# Altium footprint library 7-Connectors-12.PcbLib: 76 footprints (part 3 of 5)
Each footprint in its own frame and in the unit in brackets; x right, y up, seen from the top. Pads: shape width x height; smd on the part's side, far side on the other; paste and mask are expansions set on the pad; w line width, h text height; cw(c..) or ccw(c..) is an arc to the next point about the centre after c.
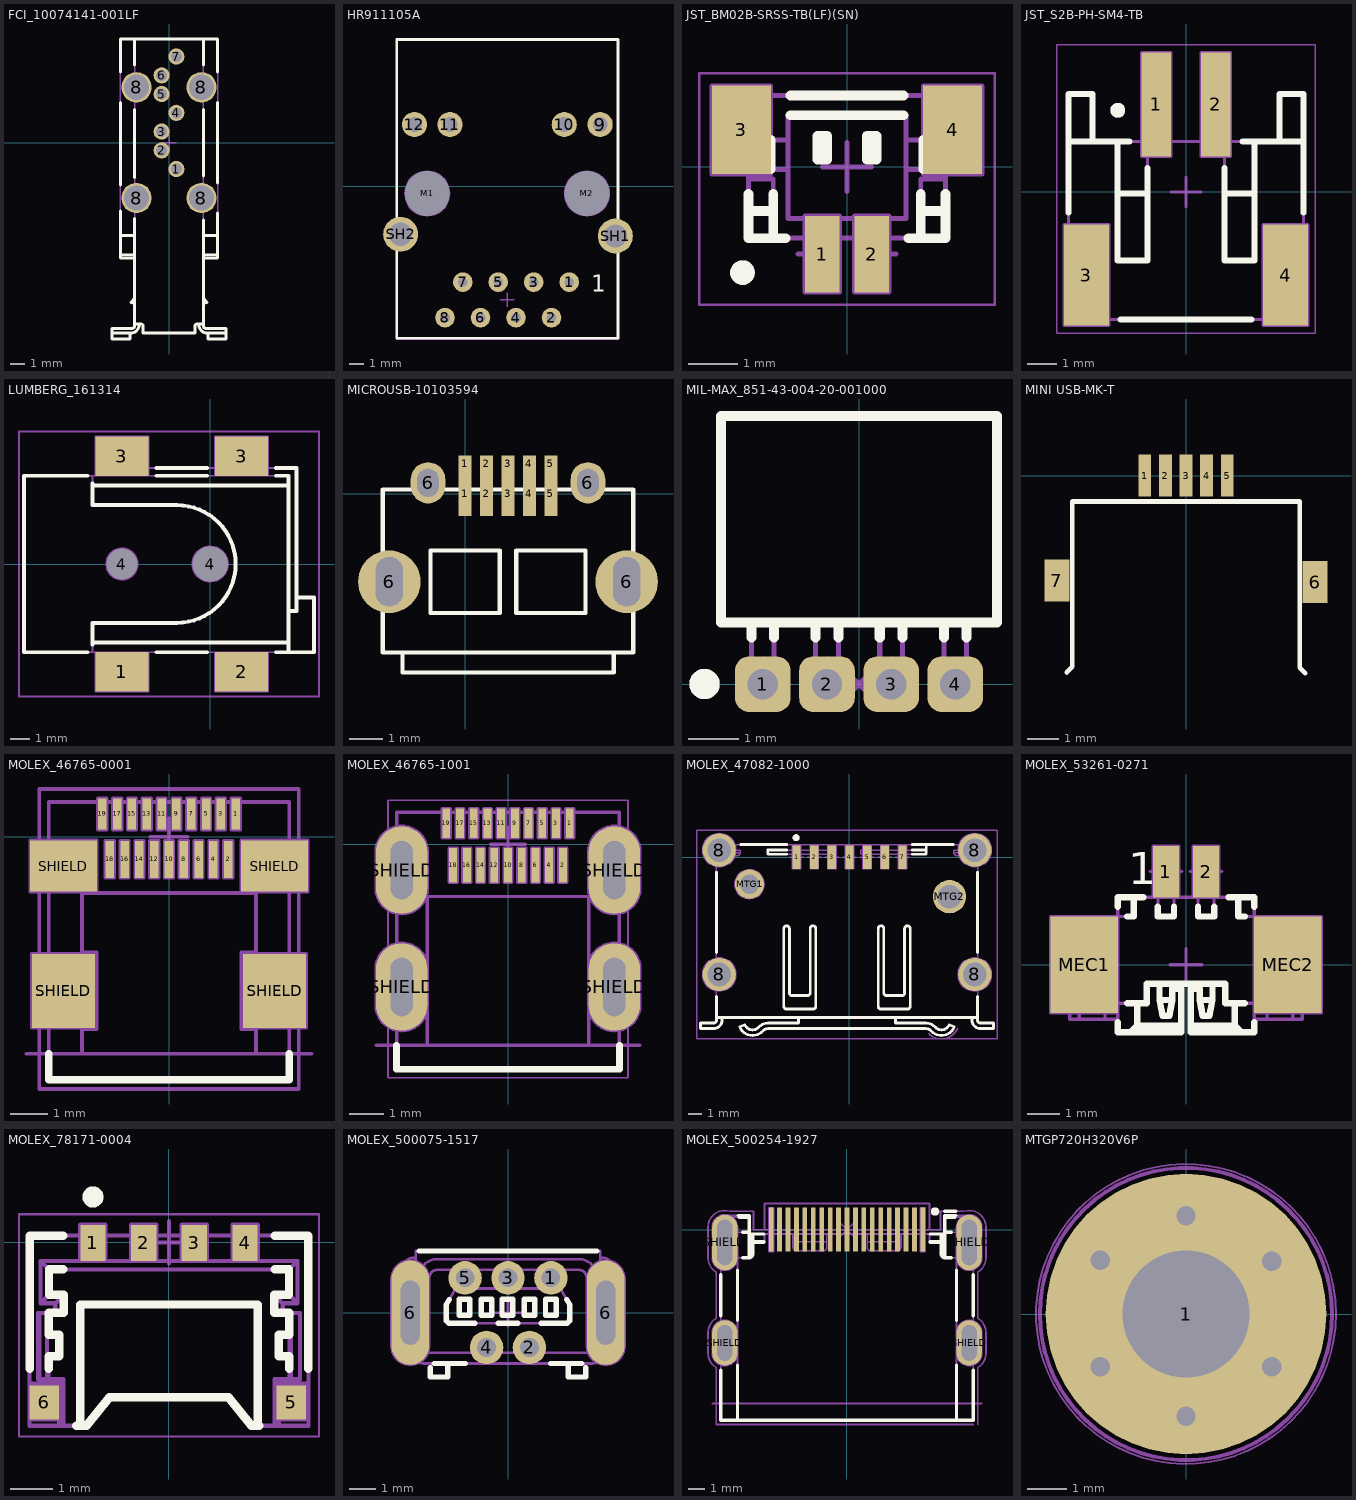
[diagram p2: the footprints below, top view; thin cyan lines are the x and y axes]

## FCI_10074141-001LF [mm] "1.27mm (.050\") Pitch, eSATA Right-Angle, Upright Plug, Through-Hole Solder"
height 19.6
pads (11):
  round 1.1 hole 0.75: 1(0.5,-1.79) 2(-0.5,-0.52) 3(-0.5,0.75) 4(0.5,2.02) 5(-0.5,3.29) 6(-0.5,4.56) 7(0.5,5.83)
  round 2.05 hole 1.7: 8(-2.2,-3.75) 8(-2.2,3.75) 8(2.2,-3.75) 8(2.2,3.75)
Top Overlay:
  lines w0.2: -3.853,-12.9 -2.493,-12.9 ccw(c-2.619,-12.321) -2.04,-12.447 -2.04,-12.287 ; -3.293,-7.8 -3.293,-4.624 ; -3.293,-7.593 -2.333,-7.593 ; -3.293,-6.287 -2.333,-6.287 ; -3.293,-2.876 -3.293,2.723 ; -3.293,4.777 -3.293,7.02 3.293,7.02 3.293,4.777 ; -2.653,-12.9 -2.653,-13.3 -3.853,-13.3 -3.853,-12.58 -2.493,-12.58 ccw(c-2.493,-12.42) -2.333,-12.42 -2.333,-5.144 ; -2.333,-12.287 -1.907,-12.287 cw(c-1.907,-12.447) -1.747,-12.447 ; -2.333,-10.927 -2.561,-10.813 -2.333,-10.5 ; -2.333,-2.356 -2.333,2.256 ; -2.333,5.244 -2.333,7.02 ; -1.747,-12.447 -1.747,-12.9 1.747,-12.9 1.747,-12.447 ; 1.747,-12.447 cw(c1.907,-12.447) 1.907,-12.287 2.333,-12.287 ; 2.04,-12.287 2.04,-12.447 ccw(c2.619,-12.321) 2.493,-12.9 3.853,-12.9 ; 2.333,-10.927 2.561,-10.813 2.333,-10.5 ; 2.333,-7.593 3.293,-7.593 ; 2.333,-6.287 3.293,-6.287 ; 2.333,-5.244 2.333,-12.42 ccw(c2.493,-12.42) 2.493,-12.58 3.853,-12.58 3.853,-13.3 2.653,-13.3 2.653,-12.9 ; 2.333,-2.256 2.333,2.256 ; 2.333,5.244 2.333,7.02 ; 3.293,-7.8 3.293,-4.777 ; 3.293,-2.723 3.293,2.723 ; -3.293,-7.807 -2.333,-7.807 -3.293,-7.807 ; 2.333,-7.807 3.293,-7.807 2.333,-7.807
Mechanical 8:
  lines w0.1: -2.7,-3.75 -2.2,-3.75 ; -2.7,3.75 -2.2,3.75 ; -2.2,-4.25 -2.2,-3.75 ; -2.2,-3.25 -2.2,-3.75 ; -2.2,3.25 -2.2,3.75 ; -2.2,4.25 -2.2,3.75 ; -1.7,-3.75 -2.2,-3.75 ; -1.7,3.75 -2.2,3.75 ; -1,-0.52 -0.5,-0.52 -0.5,-1.02 ; -1,0.75 -0.5,0.75 -0.5,1.25 ; -1,3.29 -0.5,3.29 -0.5,3.79 ; -1,4.56 -0.5,4.56 -0.5,5.06 ; -0.5,0 0,0 ; 0,-0.5 0,0 ; 0,0.5 0,0 ; 0,5.83 0.5,5.83 0.5,6.33 ; 0.5,-2.29 0.5,-1.79 1,-1.79 ; 0.5,0 0,0 ; 0.5,1.52 0.5,2.02 1,2.02 ; 1.7,-3.75 2.2,-3.75 ; 1.7,3.75 2.2,3.75 ; 2.2,-4.25 2.2,-3.75 ; 2.2,-3.25 2.2,-3.75 ; 2.2,3.25 2.2,3.75 ; 2.2,4.25 2.2,3.75 ; 2.7,-3.75 2.2,-3.75 ; 2.7,3.75 2.2,3.75
Mechanical 14:
  lines w0.1: -3.853,-12.9 -2.493,-12.9 ccw(c-2.619,-12.321) -2.04,-12.447 -2.04,-12.287 ; -3.293,-7.807 -2.333,-7.807 ; -3.293,-7.8 -3.293,7.02 3.293,7.02 3.293,-7.8 ; -3.293,-7.593 -2.333,-7.593 ; -3.293,-6.287 -2.333,-6.287 ; -2.653,-12.9 -2.653,-13.3 -3.853,-13.3 -3.853,-12.58 -2.493,-12.58 ccw(c-2.493,-12.42) -2.333,-12.42 -2.333,7.02 ; -2.333,-12.287 -1.907,-12.287 cw(c-1.907,-12.447) -1.747,-12.447 ; -2.333,-10.927 -2.561,-10.813 -2.333,-10.5 ; -1.747,-12.447 -1.747,-12.9 1.747,-12.9 1.747,-12.447 ; 1.747,-12.447 cw(c1.907,-12.447) 1.907,-12.287 2.333,-12.287 ; 2.04,-12.287 2.04,-12.447 ccw(c2.619,-12.321) 2.493,-12.9 3.853,-12.9 ; 2.333,-10.927 2.561,-10.813 2.333,-10.5 ; 2.333,-7.807 3.293,-7.807 ; 2.333,-7.593 3.293,-7.593 ; 2.333,-6.287 3.293,-6.287 ; 2.333,7.02 2.333,-12.42 ccw(c2.493,-12.42) 2.493,-12.58 3.853,-12.58 3.853,-13.3 2.653,-13.3 2.653,-12.9
3D body "FCI_10074141-001LF.stp": height 19.15, standoff -2.91, extent -3.85,-13.25 3.85,7.02

## HR911105A [mm]
pads (16):
  round 1.4 hole 0.7: 1(21.971,-6.858) 2(20.701,-9.398) 3(19.431,-6.858) 4(18.161,-9.398) 5(16.891,-6.858) 6(15.621,-9.398) 7(14.355,-6.858) 8(13.081,-9.398)
  round 1.8 hole 1.05: 9(24.181,4.42) 10(21.615,4.42) 11(13.437,4.42) 12(10.897,4.42)
  round 1 hole 3.2 unplated mask+1.1: M1(11.811,-0.508) M2(23.241,-0.508)
  round 2.5 hole 1.65: SH1(25.273,-3.556) SH2(9.906,-3.429)
Top Overlay:
  lines w0.2: 9.627,-10.871 25.451,-10.871 25.451,10.516 9.627,10.516 9.627,-10.871
  text "1" at 23.556,-7.528 h1.2
Mechanical 8:
  circle w0.1: c23.241,-0.508 r1.6
  circle w0.1: c11.811,-0.508 r1.6
  circle w0.1: c21.971,-6.858 r0.415
  circle w0.1: c14.351,-6.858 r0.415
  circle w0.1: c13.081,-9.398 r0.415
  circle w0.1: c20.701,-9.398 r0.415
  lines w0.1: 11.311,-0.508 11.811,-0.508 ; 11.811,-1.008 11.811,-0.508 ; 11.811,-0.008 11.811,-0.508 ; 12.311,-0.508 11.811,-0.508 ; 12.581,-9.398 13.081,-9.398 ; 13.081,-9.898 13.081,-9.398 ; 13.081,-8.898 13.081,-9.398 ; 13.581,-9.398 13.081,-9.398 ; 13.851,-6.858 14.351,-6.858 ; 14.351,-7.358 14.351,-6.858 ; 14.351,-6.358 14.351,-6.858 ; 14.851,-6.858 14.351,-6.858 ; 15.121,-9.398 15.621,-9.398 ; 15.621,-9.898 15.621,-9.398 ; 15.621,-8.898 15.621,-9.398 ; 16.121,-9.398 15.621,-9.398 ; 16.391,-6.858 16.891,-6.858 ; 16.891,-7.358 16.891,-6.858 ; 16.891,-6.358 16.891,-6.858 ; 17.026,-8.128 17.526,-8.128 ; 17.391,-6.858 16.891,-6.858 ; 17.526,-8.628 17.526,-8.128 ; 17.526,-7.628 17.526,-8.128 ; 17.661,-9.398 18.161,-9.398 ; 18.026,-8.128 17.526,-8.128 ; 18.161,-9.898 18.161,-9.398 ; 18.161,-8.898 18.161,-9.398 ; 18.661,-9.398 18.161,-9.398 ; 18.931,-6.858 19.431,-6.858 ; 19.431,-7.358 19.431,-6.858 ; 19.431,-6.358 19.431,-6.858 ; 19.931,-6.858 19.431,-6.858 ; 20.201,-9.398 20.701,-9.398 ; 20.701,-9.898 20.701,-9.398 ; 20.701,-8.898 20.701,-9.398 ; 21.201,-9.398 20.701,-9.398 ; 21.471,-6.858 21.971,-6.858 ; 21.971,-7.358 21.971,-6.858 ; 21.971,-6.358 21.971,-6.858 ; 22.471,-6.858 21.971,-6.858 ; 22.741,-0.508 23.241,-0.508 ; 23.241,-1.008 23.241,-0.508 ; 23.241,-0.008 23.241,-0.508 ; 23.741,-0.508 23.241,-0.508
Mechanical 14:
  lines w0.1: 9.627,-10.922 25.451,-10.922 25.451,10.541 9.627,10.541 9.627,-10.922
  text "1" at 23.556,-7.528 h1.2
3D body "User Library-HR911105A.step": height 13.5, standoff -3, extent 9.586,-10.922 25.466,10.478

## JST_BM02B-SRSS-TB(LF)(SN) [mm] "1.0mm Pitch Disconnectable Crimp Style Connector, Body 4mm x 2.9mm"
height 4.25
pads (4):
  rect 0.7x1.55 smd: 1(-0.5,-1.775) 2(0.5,-1.775)
  rect 1.2x1.8 smd: 3(-2.15,0.75) 4(2.15,0.75)
Top Overlay:
  circle w0.25: c-2.125,-2.15 r0.125
  lines w0.2: -2,-0.9 -1.5,-0.9 ; -2,-0.55 -2,-1.45 -1.25,-1.45 ; -1.55,-0.05 -1.55,0.55 ; -1.5,-1.45 -1.5,-0.55 ; -1.15,1.05 1.15,1.05 ; -1.15,1.45 1.15,1.45 ; -0.6,0.28 -0.4,0.28 ; 0.4,0.28 0.6,0.28 ; 1.25,-1.45 2,-1.45 2,-0.55 ; 1.5,-1.45 1.5,-0.55 ; 1.5,-0.9 2,-0.9 ; 1.55,-0.05 1.55,0.55 ; -0.6,0.15 -0.4,0.15 -0.4,0.63 -0.6,0.63 -0.6,0.15 ; 0.4,0.15 0.6,0.15 0.6,0.63 0.4,0.63 0.4,0.15
Mechanical 8:
  lines w0.1: -2.65,0.75 -2.15,0.75 ; -2.15,0.25 -2.15,0.75 ; -2.15,1.25 -2.15,0.75 ; -1.65,0.75 -2.15,0.75 ; -1,-1.775 -0.5,-1.775 ; -0.5,-2.275 -0.5,-1.775 ; -0.5,-1.275 -0.5,-1.775 ; -0.5,0 0,0 ; 0,-0.5 0,0 ; 0,0.5 0,0 ; 0.5,-2.275 0.5,-1.775 ; 0.5,-1.275 0.5,-1.775 ; 0.5,0 0,0 ; 1,-1.775 0.5,-1.775 ; 1.65,0.75 2.15,0.75 ; 2.15,0.25 2.15,0.75 ; 2.15,1.25 2.15,0.75 ; 2.65,0.75 2.15,0.75 ; -2.75,-0.15 -2.75,1.65 -1.55,1.65 -1.55,-0.15 -2.75,-0.15 ; -0.85,-2.55 -0.85,-1 -0.15,-1 -0.15,-2.55 -0.85,-2.55 ; 0.15,-2.55 0.15,-1 0.85,-1 0.85,-2.55 0.15,-2.55 ; 1.55,-0.15 1.55,1.65 2.75,1.65 2.75,-0.15 1.55,-0.15
Mechanical 14:
  circle w0.25: c-2.125,-2.15 r0.125
  lines w0.1: -2,-0.9 -1.5,-0.9 ; -2,-0.25 -1.5,-0.25 -1.5,-1.45 ; -1.2,-0.05 -1.55,-0.05 -1.55,0.55 -1.2,0.55 ; -0.6,-1.45 -0.6,-2.15 -0.4,-2.15 -0.4,-1.45 ; -0.6,0.28 -0.4,0.28 ; 0.4,-1.45 0.4,-2.15 0.6,-2.15 0.6,-1.45 ; 0.4,0.28 0.6,0.28 ; 1.2,-0.05 1.55,-0.05 1.55,0.55 1.2,0.55 ; 1.5,-1.45 1.5,-0.25 2,-0.25 ; 1.5,-0.9 2,-0.9 ; -2,-1.45 -2,1.45 2,1.45 2,-1.45 -2,-1.45 ; -1.2,-1.05 -1.2,1.05 1.2,1.05 1.2,-1.05 -1.2,-1.05 ; -0.6,0.15 -0.4,0.15 -0.4,0.63 -0.6,0.63 -0.6,0.15 ; 0.4,0.15 0.6,0.15 0.6,0.63 0.4,0.63 0.4,0.15
Mechanical 15:
  lines w0.05: -3,-2.8 3,-2.8 3,1.9 -3,1.9 -3,-2.8
3D body "JST_BM02B-SRSS-TB(LF)(SN).stp": height 4.32, standoff 0, extent -2,-2.15 2,1.45

## JST_S2B-PH-SM4-TB [mm] "2.0mm Pitch Disconnectable Crimp Style Connector, Body 7.9mm x 8.6mm"
height 5.5
pads (4):
  rect 1x3.5 smd: 1(-1,2.95) 2(1,2.95)
  rect 1.5x3.4 smd: 3(-3.35,-2.8) 4(3.35,-2.8)
Top Overlay:
  circle w0.25: c-2.3,2.75 r0.125
  lines w0.2: -3.95,-0.7 -3.95,3.3 -3.15,3.3 -3.15,1.7 ; -3.95,1.7 -1.9,1.7 ; -2.3,-0.05 -1.3,-0.05 ; -2.3,1.7 -2.3,-2.3 -1.3,-2.3 -1.3,0.8 ; -2.2,-4.3 2.2,-4.3 ; 1.3,-0.05 2.3,-0.05 ; 1.3,0.8 1.3,-2.3 2.3,-2.3 2.3,1.7 ; 1.9,1.7 3.95,1.7 ; 3.15,1.7 3.15,3.3 3.95,3.3 3.95,-0.7
Mechanical 8:
  lines w0.1: -3.85,-2.8 -3.35,-2.8 ; -3.35,-3.3 -3.35,-2.8 ; -3.35,-2.3 -3.35,-2.8 ; -2.85,-2.8 -3.35,-2.8 ; -1.5,2.95 -1,2.95 ; -1,2.45 -1,2.95 ; -1,3.45 -1,2.95 ; -0.5,0 0,0 ; -0.5,2.95 -1,2.95 ; 0,-0.5 0,0 ; 0,0.5 0,0 ; 0.5,0 0,0 ; 0.5,2.95 1,2.95 ; 1,2.45 1,2.95 ; 1,3.45 1,2.95 ; 1.5,2.95 1,2.95 ; 2.85,-2.8 3.35,-2.8 ; 3.35,-3.3 3.35,-2.8 ; 3.35,-2.3 3.35,-2.8 ; 3.85,-2.8 3.35,-2.8 ; -4.1,-4.5 -2.6,-4.5 -2.6,-1.1 -4.1,-1.1 -4.1,-4.5 ; -1.5,1.2 -1.5,4.7 -0.5,4.7 -0.5,1.2 -1.5,1.2 ; 0.5,1.2 0.5,4.7 1.5,4.7 1.5,1.2 0.5,1.2 ; 2.6,-4.5 4.1,-4.5 4.1,-1.1 2.6,-1.1 2.6,-4.5
Mechanical 14:
  circle w0.25: c-2.3,2.75 r0.125
  lines w0.1: -3.95,1.7 3.95,1.7 ; -3.45,-3.5 -3.45,-4.3 3.45,-4.3 3.45,-3.5 ; -3.15,1.7 -3.15,3.3 -3.95,3.3 -3.95,-3.5 -3.05,-3.5 -3.05,-4.3 ; -2.3,-0.05 -1.3,-0.05 ; -2.3,1.7 -2.3,-2.3 -1.3,-2.3 -1.3,1.7 ; -1.25,1.7 -1.25,4.3 -0.75,4.3 -0.75,1.7 ; 0.75,1.7 0.75,4.3 1.25,4.3 1.25,1.7 ; 1.3,-0.05 2.3,-0.05 ; 1.3,1.7 1.3,-2.3 2.3,-2.3 2.3,1.7 ; 3.05,-4.3 3.05,-3.5 3.95,-3.5 3.95,3.3 3.15,3.3 3.15,1.7
Mechanical 15:
  lines w0.05: -4.35,-4.75 -4.35,4.95 4.35,4.95 4.35,-4.75 -4.35,-4.75
3D body "JST_S2B-PH-SM4-TB.stp": height 5.6, standoff 0, extent -3.95,-4.3 3.95,4.3

## LUMBERG_161314 [mm] "Right Angle Surface Mount Power Supply Chassis Socket With Break Contacts"
height 11
pads (6):
  rect 2.7x2 smd: 1(-4.5,-5.5) 2(1.6,-5.5) 3(-4.5,5.5) 3(1.6,5.5)
  round 1 hole 1.6 unplated mask+0.3: 4(-4.5,0)
  round 1 hole 1.8 unplated mask+0.4: 4(0,0)
Top Overlay:
  lines w0.2: -6.25,-4.5 -9.5,-4.5 -9.5,4.5 -6.25,4.5 ; -6,-4.1 -6,-3 -1.7,-3 ccw(c-1.7,0) -1.7,3 -6,3 -6,4.1 ; -6,-4 4,-4 ; -6,4 4,4 ; -2.75,-4.5 -0.15,-4.5 ; -2.75,4.5 -0.15,4.5 ; -2.75,4.9 -0.15,4.9 ; 3.35,-4.5 4,-4.5 ; 3.35,4.5 4,4.5 4,-4.5 ; 3.35,4.9 4.4,4.9 4.4,-2.4 4,-2.4 ; 4.4,-1.7 5.3,-1.7 5.3,-4.5 4,-4.5
Mechanical 8:
  circle w0.1: c-4.5,0 r0.8
  circle w0.1: c0,0 r0.9
  lines w0.1: -5,-5.5 -4.5,-5.5 ; -5,0 -4.5,0 ; -5,5.5 -4.5,5.5 ; -4.5,-6 -4.5,-5.5 ; -4.5,-5 -4.5,-5.5 ; -4.5,-0.5 -4.5,0 ; -4.5,0.5 -4.5,0 ; -4.5,5 -4.5,5.5 ; -4.5,6 -4.5,5.5 ; -4,-5.5 -4.5,-5.5 ; -4,0 -4.5,0 ; -4,5.5 -4.5,5.5 ; -0.5,0 0,0 ; 0,-0.5 0,0 ; 0,0.5 0,0 ; 0.5,0 0,0 ; 1.1,-5.5 1.6,-5.5 ; 1.1,5.5 1.6,5.5 ; 1.6,-6 1.6,-5.5 ; 1.6,-5 1.6,-5.5 ; 1.6,5 1.6,5.5 ; 1.6,6 1.6,5.5 ; 2.1,-5.5 1.6,-5.5 ; 2.1,5.5 1.6,5.5 ; -5.85,-6.5 -3.15,-6.5 -3.15,-4.5 -5.85,-4.5 -5.85,-6.5 ; -5.85,4.5 -5.85,6.5 -3.15,6.5 -3.15,4.5 -5.85,4.5 ; 0.25,-6.5 0.25,-4.5 2.95,-4.5 2.95,-6.5 0.25,-6.5 ; 0.25,4.5 0.25,6.5 2.95,6.5 2.95,4.5 0.25,4.5
Mechanical 14:
  lines w0.1: -6,-4.5 -6,-3 -1.7,-3 ccw(c-1.7,0) -1.7,3 -6,3 -6,4.5 ; -6,-4 4,-4 ; -6,4 4,4 ; -5.25,-4.9 -3.75,-4.9 ; -5.25,-4.5 -5.25,-6.3 -3.75,-6.3 -3.75,-4.5 ; -5.25,4.5 -5.25,6.3 -3.75,6.3 -3.75,4.9 ; -5.25,4.9 4.4,4.9 4.4,-2.4 4,-2.4 ; 0.85,-4.9 2.35,-4.9 ; 0.85,-4.5 0.85,-6.3 2.35,-6.3 2.35,-4.5 ; 0.85,4.9 0.85,6.3 2.35,6.3 2.35,4.9 ; 4.4,-1.7 5.3,-1.7 5.3,-4.5 4,-4.5 ; 4,-4.5 4,4.5 -9.5,4.5 -9.5,-4.5 4,-4.5
Mechanical 15:
  lines w0.1: -9.75,-6.75 5.55,-6.75 5.55,6.75 -9.75,6.75 -9.75,-6.75
3D body "LUMBERG_161314.stp": height 11, standoff -1.2, extent -9.5,-6.3 5.3,6.3

## MICROUSB-10103594 [mm]
height 15.1
pads (14):
  rect 0.4x1.35 smd: 1(0,0) 2(0.65,0) 3(1.3,0) 4(1.95,0) 5(2.6,0)
  rect 0.4x0.5 smd: 1(0,0.9) 2(0.65,0.9) 3(1.3,0.9) 4(1.95,0.9) 5(2.6,0.9)
  rrect100% 1.9x1.9 hole 0.83 slot 1.5 at 90 deg: 6(-2.3,-2.675) 6(4.9,-2.675)
  oval 1.05x1.25 hole 0.65 slot 0.85 at 90 deg: 6(-1.125,0.325) 6(3.725,0.325)
Top Overlay:
  lines w0.127: -1.9,-5.208 -1.9,-5.425 4.5,-5.425 ; -1.9,-5.201 -1.9,-4.833 ; 4.505,-5.424 4.505,-5.179 ; 4.505,-5.2 4.505,-4.83 ; -2.5,-4.825 -2.5,0.125 5.1,0.125 5.1,-4.825 -2.5,-4.825 ; -1.05,-3.625 -1.05,-1.725 1.05,-1.725 1.05,-3.625 -1.05,-3.625 ; 1.55,-3.625 1.55,-1.725 3.65,-1.725 3.65,-3.625 1.55,-3.625
3D body "10103594.stp": height 2.85, standoff -0.75, extent -2.75,-5.343 5.29,0.69

## MIL-MAX_851-43-004-20-001000 [mm] "1.27mm Pitch SIL Right Angled Socket"
height 2.21
pads (4):
  rrect50% 1.1x1.1 hole 0.6: 1(-1.905,0) 2(-0.635,0) 3(0.635,0) 4(1.905,0)
Top Overlay:
  circle w0.3: c-3.058,0.003 r0.15
  lines w0.2: -2.129,0.923 -2.129,1.218 ; -1.68,0.923 -1.68,1.218 ; -0.859,0.923 -0.859,1.218 ; -0.41,0.923 -0.41,1.218 ; 0.41,0.923 0.41,1.218 ; 0.86,0.923 0.86,1.218 ; 1.68,0.923 1.68,1.218 ; 2.13,0.923 2.13,1.218 ; -2.731,1.218 2.731,1.218 2.73,5.308 0,5.308 -2.73,5.308 -2.731,1.218
Mechanical 8:
  lines w0.1: -2.405,0 -1.905,0 ; -1.905,-0.5 -1.905,0 ; -1.905,0.5 -1.905,0 ; -1.405,0 -1.905,0 ; -1.135,0 -0.635,0 ; -0.635,-0.5 -0.635,0 ; -0.635,0.5 -0.635,0 ; -0.354,-0.354 0,0 ; -0.354,0.354 0,0 ; -0.135,0 -0.635,0 ; 0.135,0 0.635,0 ; 0.354,-0.354 0,0 ; 0.354,0.354 0,0 ; 0.635,-0.5 0.635,0 ; 0.635,0.5 0.635,0 ; 1.135,0 0.635,0 ; 1.405,0 1.905,0 ; 1.905,-0.5 1.905,0 ; 1.905,0.5 1.905,0 ; 2.405,0 1.905,0
Mechanical 14:
  circle w0.3: c-3.058,0.003 r0.15
  lines w0.1: -2.129,1.218 -2.13,0 ccw(c-1.905,0) -1.68,0 -1.68,1.218 ; -0.859,1.218 -0.86,0 ccw(c-0.635,0) -0.41,0 -0.41,1.218 ; 0.41,1.218 0.41,0 ccw(c0.635,0) 0.86,0 0.86,1.218 ; 1.68,1.218 1.68,0 ccw(c1.905,0) 2.13,0 2.13,1.218 ; -2.731,1.218 2.731,1.218 2.73,5.308 0,5.308 -2.73,5.308 -2.731,1.218
3D body "MIL-MAX_851-43-004-20-001000.stp": height 2.21, standoff -3.6, extent -2.73,-0.225 2.731,5.308

## MINI USB-MK-T [mil]
height 87.01
pads (7):
  rect 16x52 smd mask+2: 1(-51.18,0) 2(-25.59,0) 3(0,0) 4(25.59,0) 5(51.18,0)
  rect 31.5x52 smd mask+2: 6(160,-132) 7(-160,-130)
Top Overlay:
  lines w5.91: -148,-244 -141,-237 -141,-32 141,-32 141,-238 148,-245
3D body "10103594.stp": height 112.2, standoff -29.53, extent -157.26,-247.35 159.26,-9.84

## MOLEX_46765-0001 [mm] "0.4mm Pitch, Surface Mount Right Angle 19 Contacts Micro HDMI Type-D Receptacle With Kapton Tape  And SMT Mounting Pads"
height 2.9
pads (23):
  rect 0.23x0.85 smd: 1(1.8,0.613) 3(1.4,0.613) 5(1,0.613) 7(0.6,0.613) 9(0.2,0.613) 11(-0.2,0.613) 13(-0.6,0.613) 15(-1,0.613) 17(-1.4,0.613) 19(-1.8,0.613)
  rect 0.23x1 smd: 2(1.6,-0.613) 4(1.2,-0.613) 6(0.8,-0.613) 8(0.4,-0.613) 10(0,-0.613) 12(-0.4,-0.613) 14(-0.8,-0.613) 16(-1.2,-0.613) 18(-1.6,-0.613)
  rect 1.7x2 smd: SHIELD(-2.85,-4.163) SHIELD(2.85,-4.163)
  rect 1.8x1.38 smd: SHIELD(-2.85,-0.793) SHIELD(2.85,-0.793)
Top Overlay:
  lines w0.2: -3.25,-5.863 -3.25,-6.563 3.25,-6.563 3.25,-5.863
Mechanical 8:
  drawing of 201 lines, arcs and shapes, not listed
Mechanical 14:
  lines w0.1: -3.25,-6.563 3.25,-6.563 3.25,0.938 -3.25,0.938 -3.25,-6.563
Mechanical 15:
  lines w0.1: -3.5,-6.813 3.5,-6.813 3.5,1.288 -3.5,1.288 -3.5,-6.813
3D body "MOLEX_46765-0001.stp": height 2.97, standoff 0, extent -3.25,-6.562 3.25,0.938

## MOLEX_46765-1001 [mm] "0.4mm Pitch, Surface Mount Right Angle 19 Contacts Micro HDMI Type-D Receptacle With Kapton Tape  And Thru Hole Mounting Pads"
height 2.9
pads (23):
  rect 0.23x0.85 smd: 1(1.8,0.613) 3(1.4,0.613) 5(1,0.613) 7(0.6,0.613) 9(0.2,0.613) 11(-0.2,0.613) 13(-0.6,0.613) 15(-1,0.613) 17(-1.4,0.613) 19(-1.8,0.613)
  rect 0.23x1 smd: 2(1.6,-0.613) 4(1.2,-0.613) 6(0.8,-0.613) 8(0.4,-0.613) 10(0,-0.613) 12(-0.4,-0.613) 14(-0.8,-0.613) 16(-1.2,-0.613) 18(-1.6,-0.613)
  oval 1.5x2.55 hole 0.65 slot 1.7 at 90 deg: SHIELD(-3.1,-4.163) SHIELD(-3.1,-0.753) SHIELD(3.1,-4.163) SHIELD(3.1,-0.753)
Top Overlay:
  lines w0.2: -3.25,-5.863 -3.25,-6.563 3.25,-6.563 3.25,-5.863
Mechanical 8:
  drawing of 205 lines, arcs and shapes, not listed
Mechanical 14:
  lines w0.1: -3.25,-6.563 -3.25,0.938 3.25,0.938 3.25,-6.563 -3.25,-6.563
Mechanical 15:
  lines w0.05: -3.5,-6.813 -3.5,1.288 3.5,1.288 3.5,-6.813 -3.5,-6.813
3D body "MOLEX_46765-1001.stp": height 2.97, standoff -0.55, extent -3.25,-6.562 3.25,0.938

## MOLEX_47082-1000 [mm] "1.27mm (.050\") Pitch, Surface Mount with Shell, Right Angle, External Metal-Shielded, Serial ATA Plug (SATA)"
height 5.5
pads (13):
  rect 0.6x1.7 smd: 1(-3.81,0) 2(-2.54,0) 3(-1.27,0) 4(0,0) 5(1.27,0) 6(2.54,0) 7(3.81,0)
  round 2.4 hole 1.7: 8(-9.38,-8.435) 8(-9.38,0.515) 8(9.02,-8.435) 8(9.02,0.515) MTG2(7.2,-2.835)
  round 2.1 hole 1.4: MTG1(-7.2,-1.935)
Top Overlay:
  circle w0.25: c-3.844,1.411 r0.125
  lines w0.2: -9.58,-11.53 -8.835,-11.53 -8.83,-11.535 4.52,-11.535 4.525,-11.53 9.22,-11.53 ; -9.58,-10.022 -9.58,-11.73 cw(c-9.78,-11.73) -9.78,-11.93 -10.73,-11.93 -10.73,-12.33 -9.78,-12.33 ccw(c-9.78,-11.73) -9.18,-11.73 ; -9.58,-6.847 -9.58,-1.072 ; -7.832,0.92 -4.51,0.92 ; -4.51,0.225 -5.856,0.225 cw(c-5.68,0.32) -5.88,0.32 -5.88,0.52 -4.51,0.52 ; -3.68,-11.535 -3.68,-11.93 -5.862,-11.93 ccw(c-5.862,-12.83) -6.533,-12.23 cw(c-6.98,-11.83) -7.536,-12.055 -7.907,-12.205 ccw(c-6.98,-11.83) -6.235,-12.497 cw(c-5.862,-12.83) -5.862,-12.33 5.502,-12.33 cw(c5.502,-12.83) 5.875,-12.497 ccw(c6.62,-11.83) 7.547,-12.205 7.176,-12.055 cw(c6.62,-11.83) 6.173,-12.23 ccw(c5.502,-12.83) 5.502,-11.93 3.32,-11.93 3.32,-11.535 ; 4.51,0.225 5.496,0.225 ccw(c5.32,0.32) 5.52,0.32 5.52,0.92 ; 4.51,0.52 5.52,0.52 ; 4.51,0.92 7.472,0.92 ; 8.82,-11.53 8.82,-11.73 ccw(c9.42,-11.73) 9.42,-12.33 10.37,-12.33 10.37,-11.93 9.42,-11.93 cw(c9.42,-11.73) 9.22,-11.73 9.22,-10.022 ; 9.22,-6.847 9.22,-1.072 ; -9.18,-11.73 -9.18,-11.53 -9.18,-11.73 ; -4.73,-10.73 ccw(c-4.53,-10.73) -4.53,-10.93 ; -4.73,-10.73 ccw(c-4.53,-10.73) -4.53,-10.93 ; -4.73,-10.73 -4.73,-5.13 ; -4.73,-10.73 -4.73,-5.13 ; -4.73,-5.13 cw(c-4.53,-5.13) -4.33,-5.13 ; -4.73,-5.13 cw(c-4.53,-5.13) -4.33,-5.13 ; -4.53,-10.93 -2.63,-10.93 ; -4.53,-10.93 -2.63,-10.93 ; -4.33,-9.759 ccw(c-4.13,-9.759) -4.13,-9.959 ; -4.33,-9.759 ccw(c-4.13,-9.759) -4.13,-9.959 ; -4.33,-9.759 -4.33,-5.13 ; -4.33,-9.759 -4.33,-5.13 ; -4.13,-9.959 -3.03,-9.959 ; -4.13,-9.959 -3.03,-9.959 ; -3.03,-9.959 ccw(c-3.03,-9.759) -2.83,-9.759 ; -3.03,-9.959 ccw(c-3.03,-9.759) -2.83,-9.759 ; -2.83,-9.759 -2.83,-5.13 ; -2.83,-9.759 -2.83,-5.13 ; -2.83,-5.13 cw(c-2.63,-5.13) -2.43,-5.13 ; -2.83,-5.13 cw(c-2.63,-5.13) -2.43,-5.13 ; -2.63,-10.93 ccw(c-2.63,-10.73) -2.43,-10.73 ; -2.63,-10.93 ccw(c-2.63,-10.73) -2.43,-10.73 ; -2.43,-10.73 -2.43,-5.13 ; -2.43,-10.73 -2.43,-5.13 ; -2.43,-10.73 -2.43,-5.13 ; -2.43,-10.73 -2.43,-5.13 ; 2.07,-10.73 ccw(c2.27,-10.73) 2.27,-10.93 ; 2.07,-10.73 ccw(c2.27,-10.73) 2.27,-10.93 ; 2.07,-10.73 2.07,-5.13 ; 2.07,-10.73 2.07,-5.13 ; 2.07,-5.13 cw(c2.27,-5.13) 2.47,-5.13 ; 2.07,-5.13 cw(c2.27,-5.13) 2.47,-5.13 ; 2.27,-10.93 4.17,-10.93 ; 2.27,-10.93 4.17,-10.93 ; 2.47,-9.759 ccw(c2.67,-9.759) 2.67,-9.959 ; 2.47,-9.759 ccw(c2.67,-9.759) 2.67,-9.959 ; 2.47,-9.759 2.47,-5.13 ; 2.47,-9.759 2.47,-5.13 ; 2.67,-9.959 3.77,-9.959 ; 2.67,-9.959 3.77,-9.959 ; 3.77,-9.959 ccw(c3.77,-9.759) 3.97,-9.759 ; 3.77,-9.959 ccw(c3.77,-9.759) 3.97,-9.759 ; 3.97,-9.759 3.97,-5.13 ; 3.97,-9.759 3.97,-5.13 ; 3.97,-5.13 cw(c4.17,-5.13) 4.37,-5.13 ; 3.97,-5.13 cw(c4.17,-5.13) 4.37,-5.13 ; 4.17,-10.93 ccw(c4.17,-10.73) 4.37,-10.73 ; 4.17,-10.93 ccw(c4.17,-10.73) 4.37,-10.73 ; 4.37,-10.73 4.37,-5.13 ; 4.37,-10.73 4.37,-5.13 ; 4.37,-10.73 4.37,-5.13 ; 4.37,-10.73 4.37,-5.13